# Altium footprint library Footprints.PcbLib: 50 footprints (part 2 of 4)
Each footprint in its own frame and in the unit in brackets; x right, y up, seen from the top. Pads: shape width x height; smd on the part's side, far side on the other; paste and mask are expansions set on the pad; w line width, h text height; cw(c..) or ccw(c..) is an arc to the next point about the centre after c.
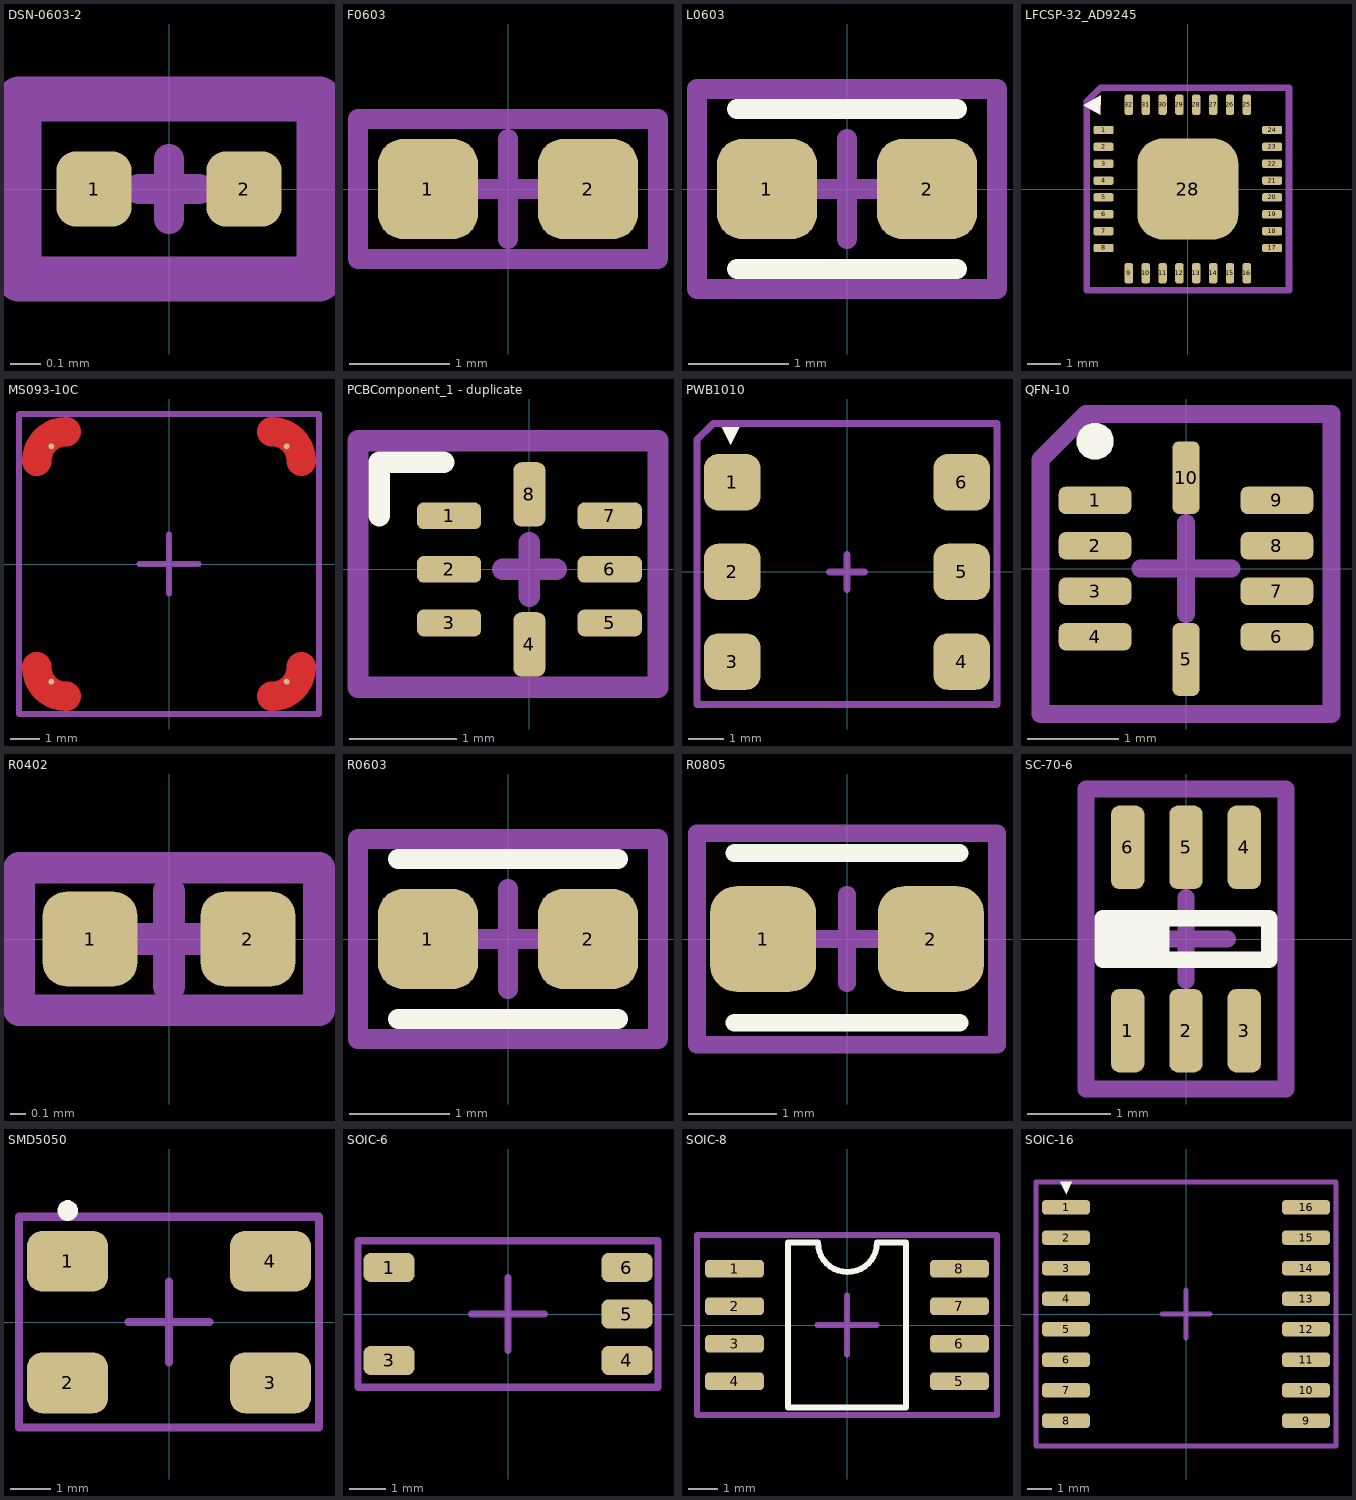
[diagram p1: the footprints below, top view; thin cyan lines are the x and y axes]

## DSN-0603-2 [mm]
pads (2):
  rrect50% 0.25x0.25 smd mask+0.051: 1(-0.25,0) 2(0.25,0)
Top Assembly:
  lines w0.1: -0.1,0 0.1,0 ; 0,-0.1 0,0.1
  lines w0.15: -0.5,-0.3 0.5,-0.3 0.5,0.3 -0.5,0.3 -0.5,-0.3
  text "'.Designator'" at -1.795,0.478 h1
3D body "User Library-SOD962.step": height 0.33, standoff 0, extent -0.3,-0.15 0.3,0.15

## F0603 [mm]
height 0.6
pads (2):
  rrect50% 1x1 smd mask+0.051: 1(-0.8,0) 2(0.8,0)
Top Assembly:
  lines w0.2: -0.5,0 0.5,0 ; 0,-0.5 0,0.5 ; -1.5,-0.7 -1.5,0.7 1.5,0.7 1.5,-0.7 -1.5,-0.7
  text "'.Designator'" at -1.645,0.903 h1
3D body "User Library-cap0603.STEP": height 0.86, standoff -0.04, extent -1.3,-0.5 1.3,0.5

## L0603 [mm]
pads (2):
  rrect50% 1x1 smd mask+0.051: 1(-0.8,0) 2(0.8,0)
Top Overlay:
  lines w0.2: -1.1,-0.8 1.1,-0.8 ; -1.1,0.8 1.1,0.8
Top Assembly:
  lines w0.2: -0.5,0 0.5,0 ; 0,-0.5 0,0.5 ; -1.5,-1 -1.5,1 1.5,1 1.5,-1 -1.5,-1
  text "'.Designator'" at -1.795,1.253 h1
3D body "SW3dPS-R0603.STEP": height 0.37, standoff 0, extent -0.8,-0.401 0.8,0.401

## LFCSP-32_AD9245 [mm]
pads (33):
  rrect50% 0.6x0.25 smd mask+0.051: 1(-2.5,1.75) 2(-2.5,1.25) 3(-2.5,0.75) 4(-2.5,0.25) 5(-2.5,-0.25) 6(-2.5,-0.75) 7(-2.5,-1.25) 8(-2.5,-1.75) 17(2.5,-1.75) 18(2.5,-1.25) 19(2.5,-0.75) 20(2.5,-0.25) 21(2.5,0.25) 22(2.5,0.75) 23(2.5,1.25) 24(2.5,1.75)
  rrect50% 0.25x0.6 smd mask+0.051: 9(-1.75,-2.5) 10(-1.25,-2.5) 11(-0.75,-2.5) 12(-0.25,-2.5) 13(0.25,-2.5) 14(0.75,-2.5) 15(1.25,-2.5) 16(1.75,-2.5) 25(1.75,2.5) 26(1.25,2.5) 27(0.75,2.5) 28(0.25,2.5) 29(-0.25,2.5) 30(-0.75,2.5) 31(-1.25,2.5) 32(-1.75,2.5)
  rrect50% 3x3 smd mask+0.051: 28(0,0)
Top Overlay:
  region: -2.6,2.2 -2.59,2.783 -3.11,2.483
Top Solder:
  region: 2,2 2,2.9 -2,2.9 -2,2
  rectangle: -2.9,-2 -2,2
  region: 2,-2.9 2,-2 -2,-2 -2,-2.9
  region: 2.9,2 2,2 2,-2 2.9,-2
Top Assembly:
  lines w0.2: -1,0 1,0 ; 0,-1 0,1 ; -3,-3 3,-3 3,3 -2.6,3 -3,2.6 -3,-3
  text "'.Designator'" at -1.695,3.278 h1
3D body "User Library-LFCSP-32_CP-32-26.step": height 1.8, standoff 0, extent -2.51,-2.51 2.51,2.51

## MS093-10C [mm]
pads (4):
  round 0.2 smd mask+0.051: 1(-4,-4) 1(-4,4) 1(4,-4) 1(4,4)
Top Layer:
  lines w1: -4.5,-3.5 ccw(c-3.5,-3.5) -3.5,-4.5 ; -4.5,3.5 cw(c-3.5,3.5) -3.5,4.5 ; 3.5,-4.5 ccw(c3.5,-3.5) 4.5,-3.5 ; 3.5,4.5 cw(c3.5,3.5) 4.5,3.5
Top Solder:
  lines w1: -4.5,-3.5 ccw(c-3.5,-3.5) -3.5,-4.5 ; -4.5,3.5 cw(c-3.5,3.5) -3.5,4.5 ; 3.5,-4.5 ccw(c3.5,-3.5) 4.5,-3.5 ; 3.5,4.5 cw(c3.5,3.5) 4.5,3.5
Top Assembly:
  lines w0.2: -1,0 1,0 ; 0,-1 0,1 ; -5.1,-5.1 -5.1,5.1 5.1,5.1 5.1,-5.1 -5.1,-5.1
  text "'.Designator'" at -1.795,1.178 h1
3D body "MS093-10C.step": height 3, standoff 0, extent -4.85,-4.85 4.85,4.85

## PCBComponent_1 - duplicate [mm]
pads (8):
  rrect50% 0.6x0.25 smd mask+0.051: 1(-0.75,0.5) 2(-0.75,0) 3(-0.75,-0.5) 5(0.75,-0.5) 6(0.75,0) 7(0.75,0.5)
  rrect50% 0.3x0.6 smd mask+0.051: 4(0,-0.7) 8(0,0.7)
Top Overlay:
  lines w0.2: -1.4,0.5 -1.4,1 -0.8,1
Top Assembly:
  lines w0.2: -0.25,0 0.25,0 ; 0,-0.25 0,0.25 ; -1.6,-1.1 -1.6,1.2 1.2,1.2 1.2,-1.1 -1.6,-1.1
  text "'.Designator'" at -1.795,1.378 h1
3D body "RUG0008A.stp": height 0.4, standoff 0, extent -0.75,-0.75 0.75,0.75

## PWB1010 [mm]
pads (6):
  rrect50% 1.6x1.6 smd mask+0.051: 1(-3.25,2.54) 2(-3.25,0) 3(-3.25,-2.54) 4(3.25,-2.54) 5(3.25,0) 6(3.25,2.54)
Top Overlay:
  region: -3.3,3.6 -3.05,4.1 -3.55,4.1
Top Assembly:
  lines w0.2: -0.5,0 0.5,0 ; 0,-0.5 0,0.5 ; -4.25,-3.75 4.25,-3.75 4.25,4.2 -3.8,4.2 -4.25,3.75 -4.25,-3.75
  text "'.Designator'" at -1.695,2.078 h1
3D body "Coilcraft-PWB Series.step": height 4.85, standoff 0.2, extent -3.6,-3.485 3.6,3.485

## QFN-10 [mm]
pads (10):
  rrect50% 0.8x0.3 smd mask+0.051: 1(-1,0.75) 2(-1,0.25) 3(-1,-0.25) 4(-1,-0.75) 6(1,-0.75) 7(1,-0.25) 8(1,0.25) 9(1,0.75)
  rrect50% 0.3x0.8 smd mask+0.051: 5(0,-1) 10(0,1)
Top Overlay:
  region: -1,1.2 -0.96,1.2 -0.887,1.23 -0.83,1.287 -0.8,1.36 -0.8,1.4 -0.8,1.44 -0.83,1.513 -0.887,1.57 -0.96,1.6 -1,1.6 -1.04,1.6 -1.113,1.57 -1.17,1.513 -1.2,1.44 -1.2,1.4 -1.2,1.36 -1.17,1.287 -1.113,1.23 -1.04,1.2
Top Assembly:
  lines w0.2: -0.5,0 0.5,0 ; 0,-0.5 0,0.5 ; -1.6,-1.6 -1.6,1.2 -1.1,1.7 1.6,1.7 1.6,-1.6 -1.6,-1.6
  text "'.Designator'" at -1.695,2.078 h1
3D body: height 0.6, standoff 0, extent -1,-1 1,1

## R0402 [mm]
height 0.55
pads (2):
  rrect50% 0.6x0.6 smd mask+0.051: 1(-0.5,0) 2(0.5,0)
Top Assembly:
  lines w0.2: -0.3,0 0.3,0 ; 0,-0.3 0,0.3 ; -0.95,-0.45 0.95,-0.45 0.95,0.45 -0.95,0.45 -0.95,-0.45
  text "'.Designator'" at -1.795,0.628 h1
3D body "SW3dPS-R0402.STEP": height 0.27, standoff 0, extent -0.5,-0.251 0.5,0.251

## R0603 [mm]
height 0.55
pads (2):
  rrect50% 1x1 smd mask+0.051: 1(-0.8,0) 2(0.8,0)
Top Overlay:
  lines w0.2: -1.1,-0.8 1.1,-0.8 ; -1.1,0.8 1.1,0.8
Top Assembly:
  lines w0.2: -0.5,0 0.5,0 ; 0,-0.5 0,0.5 ; -1.5,-1 -1.5,1 1.5,1 1.5,-1 -1.5,-1
  text "'.Designator'" at -1.795,1.578 h1
3D body "SW3dPS-R0603.STEP": height 0.37, standoff 0, extent -0.8,-0.401 0.8,0.401

## R0805 [mm]
pads (2):
  rrect50% 1.2x1.2 smd mask+0.051: 1(-0.95,0) 2(0.95,0)
Top Overlay:
  lines w0.2: -1.275,-0.95 1.275,-0.95 ; -1.275,0.975 1.275,0.975
Top Assembly:
  lines w0.2: -0.5,0 0.5,0 ; 0,-0.5 0,0.5 ; -1.7,-1.2 1.7,-1.2 1.7,1.2 -1.7,1.2 -1.7,-1.2
  text "'.Designator'" at -1.795,1.378 h1
3D body "SW3dPS-R0805.STEP": height 0.47, standoff 0, extent -1,-0.626 1,0.626

## SC-70-6 [mm] "DCK(R-PDSO-G6)"
pads (6):
  rrect50% 0.4x1 smd mask+0.051: 1(-0.7,-1.1) 2(0,-1.1) 3(0.7,-1.1) 4(0.7,1.1) 5(0,1.1) 6(-0.7,1.1)
Top Overlay:
  rectangle: -1,-0.3 -0.2,0.25
  lines w0.2: -1,-0.25 1,-0.25 1,0.25 -1,0.25 -1,-0.25
Top Assembly:
  lines w0.2: -0.5,0 0.5,0 ; 0,-0.5 0,0.5 ; -1.2,-1.8 1.2,-1.8 1.2,1.8 -1.2,1.8 -1.2,-1.8
  text "'.Designator'" at -1.795,1.978 h1
3D body "User Library-DCK(R-PDSO-G6).step": height 1.1, standoff 0, extent -1,-1.1 1,1.1

## SMD5050 [mm]
pads (4):
  rrect50% 2x1.5 smd mask+0.051: 1(-2.5,1.5) 2(-2.5,-1.5) 3(2.5,-1.5) 4(2.5,1.5)
Top Overlay:
  region: -2.5,2.5 -2.45,2.5 -2.358,2.538 -2.288,2.608 -2.25,2.7 -2.25,2.75 -2.25,2.8 -2.288,2.892 -2.358,2.962 -2.45,3 -2.5,3 -2.55,3 -2.642,2.962 -2.712,2.892 -2.75,2.8 -2.75,2.75 -2.75,2.7 -2.712,2.608 -2.642,2.538 -2.55,2.5
Top Assembly:
  lines w0.2: -1,0 1,0 ; 0,-1 0,1 ; -3.7,-2.6 -3.7,2.6 3.7,2.6 3.7,-2.6 -3.7,-2.6
  text "'.Designator'" at -1.795,2.778 h1
3D body "User Library-ws2812B-1.step": height 1.55, standoff -0.02, extent -2.7,-2.5 2.7,2.5

## SOIC-6 [mm]
pads (5):
  rrect50% 1.4x0.8 smd mask+0.051: 1(-3.25,1.27) 3(-3.25,-1.27) 4(3.25,-1.27) 5(3.25,0) 6(3.25,1.27)
Top Assembly:
  lines w0.2: -1,0 1,0 ; 0,-1 0,1 ; -4.1,-2 4.1,-2 4.1,2 -4.1,2 -4.1,-2
  text "'.Designator'" at -1.795,1.178 h1
3D body "User Library-SO6-5.step": height 1.7, standoff 0, extent -3.146,-1.905 3.504,1.795

## SOIC-8 [mm]
pads (8):
  rrect50% 2x0.6 smd mask+0.051: 1(-3.81,1.905) 2(-3.81,0.635) 3(-3.81,-0.635) 4(-3.81,-1.905) 5(3.81,-1.905) 6(3.81,-0.635) 7(3.81,0.635) 8(3.81,1.905)
Top Overlay:
  lines w0.2: -1.016,2.794 -2,2.794 -2,-2.794 2,-2.794 2,2.794 1.016,2.794 cw(c0.016,2.794) 0.016,1.794 cw(c0.016,2.794) -0.984,2.794
Top Assembly:
  lines w0.2: -1,0 1,0 ; 0,-1 0,1 ; -5.08,-3.048 5.08,-3.048 5.08,3.048 -5.08,3.048 -5.08,-3.048
  text "'.Designator'" at -1.795,3.226 h1
3D body "User Library-SOIC8_(ATTINY12) (1).step": height 2.25, standoff -0.07, extent -4.196,-2.69 4.196,2.69

## SOIC-16 [mm]
pads (16):
  rrect50% 2x0.6 smd mask+0.051: 1(-5,4.445) 2(-5,3.175) 3(-5,1.905) 4(-5,0.635) 5(-5,-0.635) 6(-5,-1.905) 7(-5,-3.175) 8(-5,-4.445) 9(5,-4.445) 10(5,-3.175) 11(5,-1.905) 12(5,-0.635) 13(5,0.635) 14(5,1.905) 15(5,3.175) 16(5,4.445)
Top Overlay:
  region: -5,5 -4.75,5.5 -5.25,5.5
Top Assembly:
  lines w0.2: -1,0 1,0 ; 0,-1 0,1 ; -6.25,-5.5 6.25,-5.5 6.25,5.5 -6.25,5.5 -6.25,-5.5
  text "'.Designator'" at -1.695,2.078 h1
3D body "User Library-SOIC16_Wide_JEDEC_MS-013AA (1).step": height 2.72, standoff 0.07, extent -5.315,-5.25 5.315,5.25